# Altium footprint library Indruino.PcbLib: 383 footprints (part 20 of 24)
Each footprint in its own frame and in the unit in brackets; x right, y up, seen from the top. Pads: shape width x height; smd on the part's side, far side on the other; paste and mask are expansions set on the pad; w line width, h text height; cw(c..) or ccw(c..) is an arc to the next point about the centre after c.
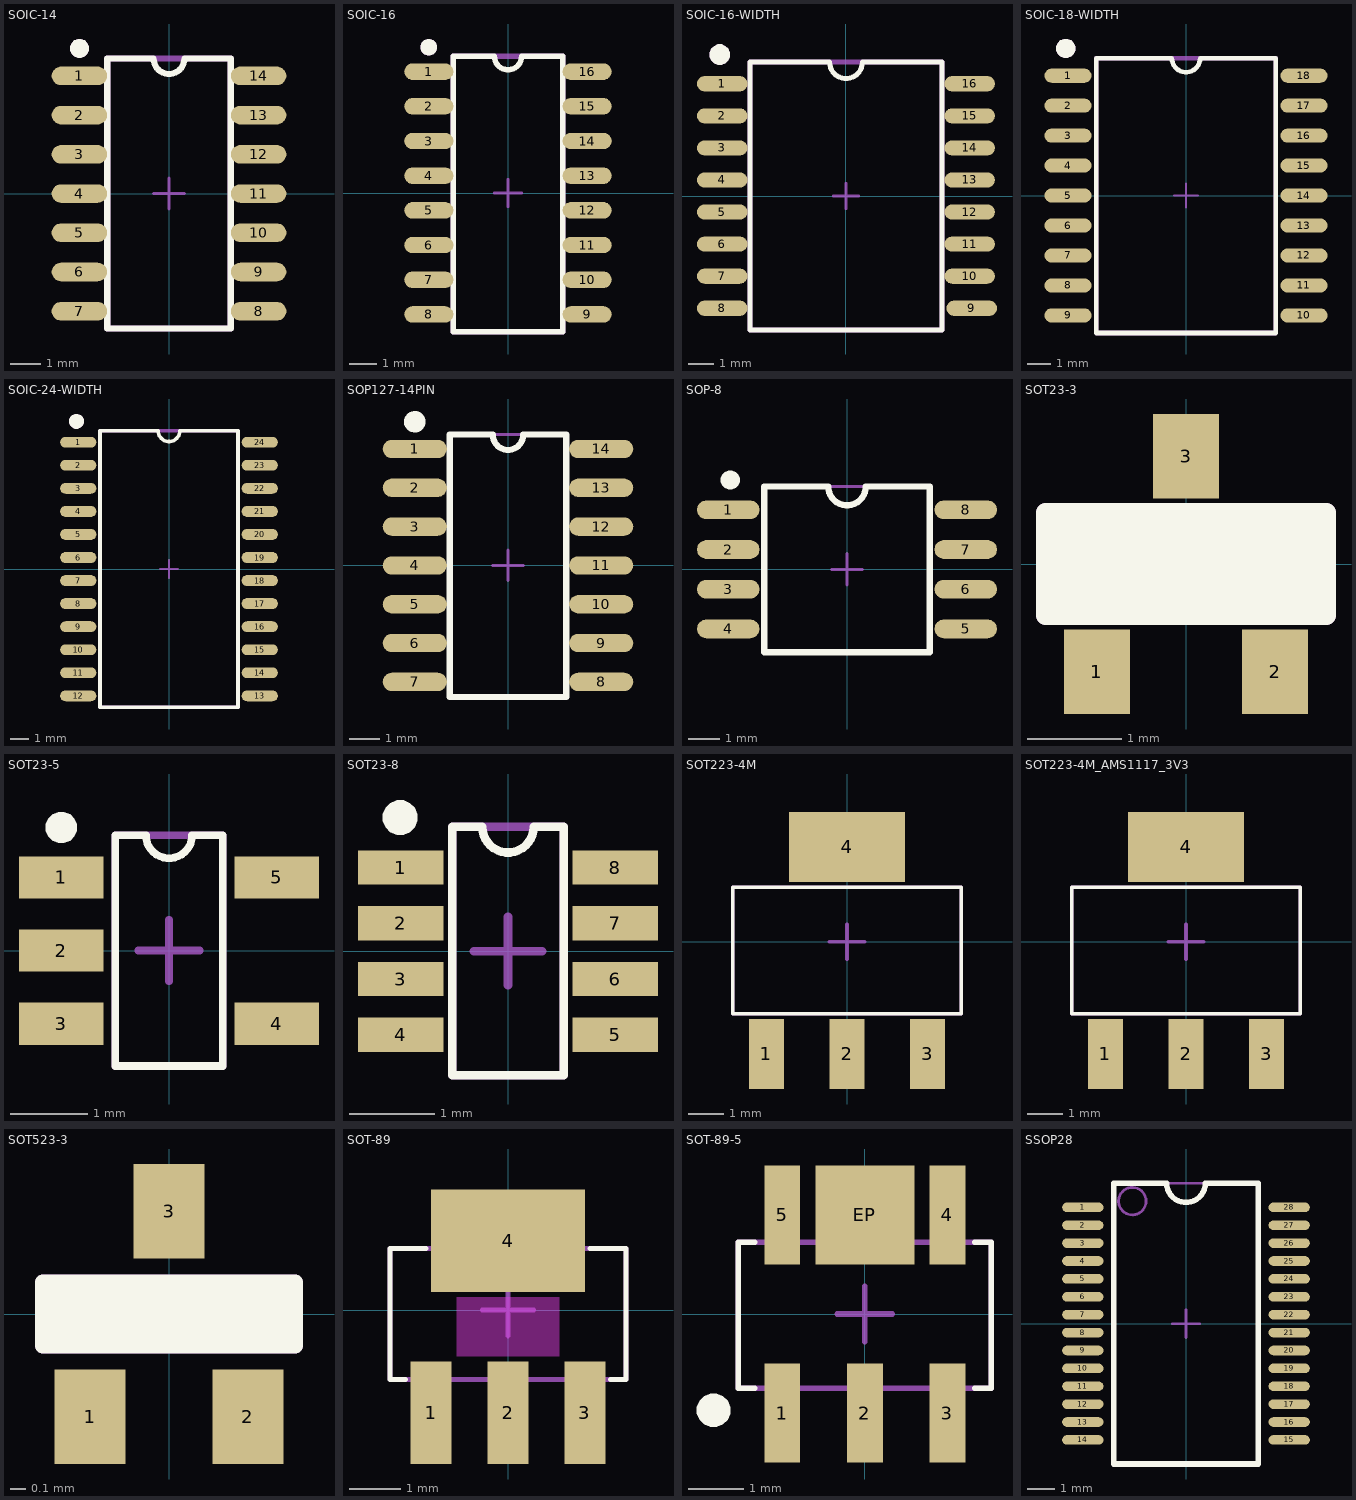
[diagram p19: the footprints below, top view; thin cyan lines are the x and y axes]

## SOIC-14 [mm] "14-Pin Small Outline Package 1.27 mm Pitch"
height 2
pads (14):
  oval 1.8x0.6 smd: 1(-2.9,3.81) 2(-2.9,2.54) 3(-2.9,1.27) 4(-2.9,0) 5(-2.9,-1.27) 6(-2.9,-2.54) 7(-2.9,-3.81) 8(2.9,-3.81) 9(2.9,-2.54) 10(2.9,-1.27) 11(2.9,0) 12(2.9,1.27) 13(2.9,2.54) 14(2.9,3.81)
Top Overlay:
  region: -2.9,4.405 -2.96,4.405 -3.07,4.451 -3.154,4.535 -3.2,4.645 -3.2,4.705 -3.2,4.765 -3.154,4.875 -3.07,4.959 -2.96,5.005 -2.9,5.005 -2.84,5.005 -2.73,4.959 -2.646,4.875 -2.6,4.765 -2.6,4.705 -2.6,4.645 -2.646,4.535 -2.73,4.451 -2.84,4.405
  lines w0.2: -2,-4.375 -2,4.375 -0.5,4.375 ccw(c0,4.375) 0.5,4.375 2,4.375 2,-4.375 -2,-4.375
Mechanical 13:
  region: -2.9,4.405 -2.96,4.405 -3.07,4.451 -3.154,4.535 -3.2,4.645 -3.2,4.705 -3.2,4.765 -3.154,4.875 -3.07,4.959 -2.96,5.005 -2.9,5.005 -2.84,5.005 -2.73,4.959 -2.646,4.875 -2.6,4.765 -2.6,4.705 -2.6,4.645 -2.646,4.535 -2.73,4.451 -2.84,4.405
  lines w0.2: -2,-4.375 -2,4.375 2,4.375 2,-4.375 -2,-4.375
  text "'.Designator'" at -0.525,3.8 h1.2
Mechanical 15:
  lines w0.1: -0.5,0 0.5,0 ; 0,-0.5 0,0.5
3D body "User Library-SOIC-14.step": height 1.75, standoff 0, extent -3,-4.375 3,4.375

## SOIC-16 [mm] "16-Pin Small Outline Package 1.27 mm Pitch"
height 2
pads (16):
  oval 1.8x0.6 smd: 1(-2.9,4.445) 2(-2.9,3.175) 3(-2.9,1.905) 4(-2.9,0.635) 5(-2.9,-0.635) 6(-2.9,-1.905) 7(-2.9,-3.175) 8(-2.9,-4.445) 9(2.9,-4.445) 10(2.9,-3.175) 11(2.9,-1.905) 12(2.9,-0.635) 13(2.9,0.635) 14(2.9,1.905) 15(2.9,3.175) 16(2.9,4.445)
Top Overlay:
  region: -2.9,5.04 -2.96,5.04 -3.07,5.086 -3.154,5.17 -3.2,5.28 -3.2,5.34 -3.2,5.4 -3.154,5.51 -3.07,5.594 -2.96,5.64 -2.9,5.64 -2.84,5.64 -2.73,5.594 -2.646,5.51 -2.6,5.4 -2.6,5.34 -2.6,5.28 -2.646,5.17 -2.73,5.086 -2.84,5.04
  lines w0.2: -2,-5.08 2,-5.08 2,5.01 0.5,5.01 cw(c0,5.01) -0.5,5.01 -2,5.01 -2,-5.08
Mechanical 13:
  region: -2.9,5.04 -2.96,5.04 -3.07,5.086 -3.154,5.17 -3.2,5.28 -3.2,5.34 -3.2,5.4 -3.154,5.51 -3.07,5.594 -2.96,5.64 -2.9,5.64 -2.84,5.64 -2.73,5.594 -2.646,5.51 -2.6,5.4 -2.6,5.34 -2.6,5.28 -2.646,5.17 -2.73,5.086 -2.84,5.04
  lines w0.2: -2,-5.08 2,-5.08 2,5.01 -2,5.01 -2,-5.08
  text "'.Designator'" at -0.4,4.425 h1.2
Mechanical 15:
  lines w0.1: -0.5,0 0.5,0 ; 0,-0.5 0,0.5
3D body "User Library-SOIC-16-2.STEP": height 1.75, standoff 0, extent -3,-5 3,5

## SOIC-16-WIDTH [mm]
pads (16):
  oval 2x0.6 smd: 1(-4.9,4.445) 2(-4.9,3.175) 3(-4.9,1.905) 4(-4.9,0.635) 5(-4.9,-0.635) 6(-4.9,-1.905) 7(-4.9,-3.175) 8(-4.9,-4.445) 9(4.98,-4.445) 10(4.9,-3.175) 11(4.9,-1.905) 12(4.9,-0.635) 13(4.9,0.635) 14(4.9,1.905) 15(4.9,3.175) 16(4.9,4.445)
Top Overlay:
  region: -5,5.2 -5.08,5.2 -5.227,5.261 -5.339,5.373 -5.4,5.52 -5.4,5.6 -5.4,5.68 -5.339,5.827 -5.227,5.939 -5.08,6 -5,6 -4.92,6 -4.773,5.939 -4.661,5.827 -4.6,5.68 -4.6,5.6 -4.6,5.52 -4.661,5.373 -4.773,5.261 -4.92,5.2
  lines w0.2: -3.8,-5.3 -3.8,5.3 -0.65,5.3 ccw(c0,5.3) 0.65,5.3 3.8,5.3 3.8,-5.3 -3.8,-5.3
Mechanical 13:
  region: -5,5.2 -5.08,5.2 -5.227,5.261 -5.339,5.373 -5.4,5.52 -5.4,5.6 -5.4,5.68 -5.339,5.827 -5.227,5.939 -5.08,6 -5,6 -4.92,6 -4.773,5.939 -4.661,5.827 -4.6,5.68 -4.6,5.6 -4.6,5.52 -4.661,5.373 -4.773,5.261 -4.92,5.2
  lines w0.2: -3.8,-5.3 3.8,-5.3 3.8,5.3 -3.8,5.3 -3.8,-5.3
  text "'.Designator'" at -0.525,4.8 h1.2
Mechanical 15:
  lines w0.1: -0.5,0 0.5,0 ; 0,-0.5 0,0.5
3D body "User Library-SOIC16_Wide_JEDEC_MS-013AA.step": height 2.62, standoff -0.03, extent -5.315,-5.25 5.315,5.25

## SOIC-18-WIDTH [mm]
pads (18):
  oval 2x0.6 smd: 1(-5,5.08) 2(-5,3.81) 3(-5,2.54) 4(-5,1.27) 5(-5,0) 6(-5,-1.27) 7(-5,-2.54) 8(-5,-3.81) 9(-5,-5.08) 10(5,-5.08) 11(5,-3.81) 12(5,-2.54) 13(5,-1.27) 14(5,0) 15(5,1.27) 16(5,2.54) 17(5,3.81) 18(5,5.08)
Top Overlay:
  region: -5.1,5.835 -5.18,5.835 -5.327,5.896 -5.439,6.008 -5.5,6.155 -5.5,6.235 -5.5,6.315 -5.439,6.462 -5.327,6.574 -5.18,6.635 -5.1,6.635 -5.02,6.635 -4.873,6.574 -4.761,6.462 -4.7,6.315 -4.7,6.235 -4.7,6.155 -4.761,6.008 -4.873,5.896 -5.02,5.835
  lines w0.2: -3.8,-5.825 3.8,-5.825 3.8,5.825 0.6,5.825 cw(c0,5.825) -0.6,5.825 -3.8,5.825 -3.8,-5.825
Mechanical 13:
  region: -5.1,5.835 -5.18,5.835 -5.327,5.896 -5.439,6.008 -5.5,6.155 -5.5,6.235 -5.5,6.315 -5.439,6.462 -5.327,6.574 -5.18,6.635 -5.1,6.635 -5.02,6.635 -4.873,6.574 -4.761,6.462 -4.7,6.315 -4.7,6.235 -4.7,6.155 -4.761,6.008 -4.873,5.896 -5.02,5.835
  lines w0.2: -3.8,-5.825 -3.8,5.825 3.8,5.825 3.8,-5.825 -3.8,-5.825
  text "'.Designator'" at -0.4,5.3 h1.2
Mechanical 15:
  lines w0.1: -0.5,0 0.5,0 ; 0,-0.5 0,0.5
3D body "SW3dPS-SOIC18-300.STEP": height 2.65, standoff 0, extent -5.15,-5.765 5.15,5.765

## SOIC-24-WIDTH [mm]
pads (24):
  oval 2x0.6 smd: 1(-5,6.985) 2(-5,5.715) 3(-5,4.445) 4(-5,3.175) 5(-5,1.905) 6(-5,0.635) 7(-5,-0.635) 8(-5,-1.905) 9(-5,-3.175) 10(-5,-4.445) 11(-5,-5.715) 12(-5,-6.985) 13(5,-6.985) 14(5,-5.715) 15(5,-4.445) 16(5,-3.175) 17(5,-1.905) 18(5,-0.635) 19(5,0.635) 20(5,1.905) 21(5,3.175) 22(5,4.445) 23(5,5.715) 24(5,6.985)
Top Overlay:
  region: -5.1,7.74 -5.18,7.74 -5.327,7.801 -5.439,7.913 -5.5,8.06 -5.5,8.14 -5.5,8.22 -5.439,8.367 -5.327,8.479 -5.18,8.54 -5.1,8.54 -5.02,8.54 -4.873,8.479 -4.761,8.367 -4.7,8.22 -4.7,8.14 -4.7,8.06 -4.761,7.913 -4.873,7.801 -5.02,7.74
  lines w0.2: -3.8,-7.62 -3.8,7.62 -0.6,7.62 ccw(c0,7.62) 0.6,7.62 3.8,7.62 3.8,-7.62 -3.8,-7.62
Mechanical 13:
  region: -5.1,7.74 -5.18,7.74 -5.327,7.801 -5.439,7.913 -5.5,8.06 -5.5,8.14 -5.5,8.22 -5.439,8.367 -5.327,8.479 -5.18,8.54 -5.1,8.54 -5.02,8.54 -4.873,8.479 -4.761,8.367 -4.7,8.22 -4.7,8.14 -4.7,8.06 -4.761,7.913 -4.873,7.801 -5.02,7.74
  lines w0.2: -3.8,-7.62 3.8,-7.62 3.8,7.62 -3.8,7.62 -3.8,-7.62
  text "'.Designator'" at -0.525,7.05 h1.2
Mechanical 15:
  lines w0.1: -0.5,0 0.5,0 ; 0,-0.5 0,0.5
3D body "User Library-SOIC_24-300.STEP": height 2.6, standoff 0, extent -5.19,-7.85 5.21,7.55

## SOP127-14PIN [mm] "14-Pin Small Outline Package 1.27 mm Pitch"
height 2
pads (14):
  oval 2.1x0.6 smd: 1(-3.048,3.81) 2(-3.048,2.54) 3(-3.048,1.27) 4(-3.048,0) 5(-3.048,-1.27) 6(-3.048,-2.54) 7(-3.048,-3.81) 8(3.048,-3.81) 9(3.048,-2.54) 10(3.048,-1.27) 11(3.048,0) 12(3.048,1.27) 13(3.048,2.54) 14(3.048,3.81)
Top Overlay:
  circle w0.2: c-3.048,4.699 r0.254
  region: -3.048,4.445 -3.099,4.445 -3.192,4.484 -3.263,4.555 -3.302,4.648 -3.302,4.699 -3.302,4.75 -3.263,4.843 -3.192,4.914 -3.099,4.953 -3.048,4.953 -2.997,4.953 -2.904,4.914 -2.833,4.843 -2.794,4.75 -2.794,4.699 -2.794,4.648 -2.833,4.555 -2.904,4.484 -2.997,4.445
  lines w0.2: -1.905,-4.3 -1.905,4.28 -0.5,4.28 ccw(c0,4.28) 0.5,4.28 1.905,4.28 1.905,-4.3 -1.905,-4.3
Mechanical 13:
  lines w0.1: -1.905,-4.3 -1.905,4.28 1.905,4.28 1.905,-4.3 -1.905,-4.3
Mechanical 15:
  lines w0.1: -0.5,0 0.5,0 ; 0,-0.5 0,0.5
3D body "User Library-14-SOP.STEP": height 1.8, standoff 0, extent -3,-4.28 3,4.28

## SOP-8 [mm]
pads (8):
  oval 2x0.6 smd: 1(-3.8,1.905) 2(-3.8,0.635) 3(-3.8,-0.635) 4(-3.8,-1.905) 5(3.8,-1.905) 6(3.8,-0.635) 7(3.8,0.635) 8(3.8,1.905)
Top Overlay:
  region: -3.738,2.562 -3.798,2.562 -3.908,2.608 -3.992,2.692 -4.038,2.802 -4.038,2.862 -4.038,2.922 -3.992,3.032 -3.908,3.116 -3.798,3.162 -3.738,3.162 -3.678,3.162 -3.568,3.116 -3.484,3.032 -3.438,2.922 -3.438,2.862 -3.438,2.802 -3.484,2.692 -3.568,2.608 -3.678,2.562
  lines w0.2: -2.65,-2.65 -2.65,2.65 -0.6,2.65 ccw(c0,2.65) 0.6,2.65 2.65,2.65 2.65,-2.65 -2.65,-2.65
Mechanical 13:
  lines w0.1: -2.65,-2.65 -2.65,2.65 2.65,2.65 2.65,-2.65 -2.65,-2.65
Mechanical 15:
  lines w0.1: -0.5,0 0.5,0 ; 0,-0.5 0,0.5
3D body "User Library-SOIC8_Wide_5mmx5mm.step": height 1.75, standoff -0.01, extent -4.052,-2.73 4.05,2.73

## SOT23-3 [mm]
pads (3):
  rect 0.7x0.9 smd: 1(-0.95,-1.15) 2(0.95,-1.15) 3(0,1.15)
Top Overlay:
  region: -1.5,-0.55 1.5,-0.55 1.5,0.55 -1.5,0.55
  lines w0.2: -1.5,-0.55 1.5,-0.55 1.5,0.55 -1.5,0.55 -1.5,-0.55
Mechanical 13:
  region: -1.5,-0.55 1.5,-0.55 1.5,0.55 -1.5,0.55
  lines w0.2: -1.5,-0.55 1.5,-0.55 1.5,0.55 -1.5,0.55 -1.5,-0.55
  text "'.Designator'" at -1.3,-2.6 h1.2
Mechanical 15:
  lines w0.1: -0.5,0 0.5,0 ; 0,-0.5 0,0.5
3D body "SW3DPS-SOT-23-DEFAULT.STEP": height 1.06, standoff -0.04, extent -1.5,-1.28 1.5,1.22

## SOT23-5 [mm]
pads (5):
  rect 1.1x0.55 smd: 1(-1.4,0.95) 2(-1.4,0) 3(-1.4,-0.95) 4(1.4,-0.95) 5(1.4,0.95)
Top Overlay:
  region: -1.4,1.4 -1.44,1.4 -1.513,1.43 -1.57,1.487 -1.6,1.56 -1.6,1.6 -1.6,1.64 -1.57,1.713 -1.513,1.77 -1.44,1.8 -1.4,1.8 -1.36,1.8 -1.287,1.77 -1.23,1.713 -1.2,1.64 -1.2,1.6 -1.2,1.56 -1.23,1.487 -1.287,1.43 -1.36,1.4
  lines w0.1: -0.7,-1.5 -0.7,1.5 -0.3,1.5 ccw(c0,1.5) 0.3,1.5 0.7,1.5 0.7,-1.5 -0.7,-1.5
Mechanical 13:
  lines w0.1: -0.7,-1.5 -0.7,1.5 0.7,1.5 0.7,-1.5 -0.7,-1.5
Mechanical 15:
  lines w0.1: -0.4,0 0.4,0 ; 0,-0.4 0,0.4
3D body "User Library-SOT23-5-1.STEP": height 1.3, standoff 0, extent -1.48,-1.5 1.52,1.5

## SOT23-8 [mm]
pads (8):
  rect 1x0.4 smd: 1(-1.25,0.975) 2(-1.25,0.325) 3(-1.25,-0.325) 4(-1.25,-0.975) 5(1.25,-0.975) 6(1.25,-0.325) 7(1.25,0.325) 8(1.25,0.975)
Top Overlay:
  region: -1.259,1.359 -1.298,1.359 -1.372,1.389 -1.428,1.445 -1.459,1.519 -1.459,1.559 -1.459,1.598 -1.428,1.672 -1.372,1.728 -1.298,1.759 -1.259,1.759 -1.219,1.759 -1.145,1.728 -1.089,1.672 -1.059,1.598 -1.059,1.559 -1.059,1.519 -1.089,1.445 -1.145,1.389 -1.219,1.359
  lines w0.1: -0.65,-1.45 0.65,-1.45 0.65,1.45 0.3,1.45 cw(c0,1.45) -0.3,1.45 -0.65,1.45 -0.65,-1.45
Mechanical 13:
  lines w0.1: -0.65,-1.45 -0.65,1.45 0.65,1.45 0.65,-1.45 -0.65,-1.45
Mechanical 15:
  lines w0.1: -0.4,0 0.4,0 ; 0,-0.4 0,0.4
3D body "User Library-sot238.step": height 1.2, standoff 0, extent -1.38,-1.47 1.42,1.47

## SOT223-4M [mm] "SOT223, 4-Leads, Body 6.5x3.5mm, Pitch 2.3mm, Lead Span 7mm, IPC Low Density"
height 1.8
pads (4):
  rect 1x2 smd: 1(-2.3,-3.2) 2(0,-3.2) 3(2.3,-3.2)
  rect 3.3x2 smd: 4(0,2.7)
Top Overlay:
  lines w0.1: -3.25,-2.05 3.26,-2.05 3.26,1.55 -3.25,1.55 -3.25,-2.05
Mechanical 13:
  lines w0.1: -3.25,-2.05 3.25,-2.05 3.25,1.55 -3.25,1.55 -3.25,-2.05
Mechanical 15:
  lines w0.1: -0.5,0 0.5,0 ; 0,-0.5 0,0.5
3D body "User Library-SOT-223-3.step": height 1.67, standoff -0.01, extent -3.25,-3.74 3.25,3.22

## SOT223-4M_AMS1117_3V3 [mm] "SOT223, 4-Leads, Body 6.5x3.5mm, Pitch 2.3mm, Lead Span 7mm, IPC Low Density"
height 1.8
pads (4):
  rect 1x2 smd: 1(-2.3,-3.2) 2(0,-3.2) 3(2.3,-3.2)
  rect 3.3x2 smd: 4(0,2.7)
Top Overlay:
  lines w0.1: -3.25,-2.05 3.26,-2.05 3.26,1.55 -3.25,1.55 -3.25,-2.05
Mechanical 13:
  lines w0.1: -3.25,-2.05 3.25,-2.05 3.25,1.55 -3.25,1.55 -3.25,-2.05
Mechanical 15:
  lines w0.1: -0.5,0 0.5,0 ; 0,-0.5 0,0.5
3D body "AMS1117_3V3_axisY.step": height 1.9, standoff -0.01, extent -3.355,-3.909 3.355,3.391

## SOT523-3 [mm]
pads (3):
  rect 0.45x0.6 smd: 1(-0.5,-0.65) 2(0.5,-0.65) 3(0,0.65)
Top Overlay:
  region: -0.8,-0.2 0.8,-0.2 0.8,0.2 -0.8,0.2
  lines w0.1: -0.8,-0.2 0.8,-0.2 0.8,0.2 -0.8,0.2 -0.8,-0.2
Mechanical 13:
  lines w0.1: -0.8,-0.2 -0.8,0.2 0.8,0.2 0.8,-0.2 -0.8,-0.2
3D body "User Library-SOT-523.STEP": height 0.8, standoff 0, extent -0.8,-0.8 0.8,0.8

## SOT-89 [mm] "SOT-223/SC-73; 4 Leads; Body 6.7 x 7.3 mm, inc. leads (LxW max)"
height 1.8
pads (4):
  rect 0.8x2 smd: 1(-1.5,-2) 2(0,-2) 3(1.5,-2)
  rect 3x2 smd: 4(0,1.35)
Top Overlay:
  lines w0.1: -2,-1.35 -2.3,-1.35 -2.3,1.2 -1.6,1.2 ; 1.6,1.2 2.3,1.2 2.3,-1.35 2,-1.35
Keep-Out Layer:
  pour cut-out: -1,-0.9 1,-0.9 1,0.25 -1,0.25
Mechanical 13:
  lines w0.1: -2.3,-1.35 2.3,-1.35 2.3,1.2 -2.3,1.2 -2.3,-1.35
Mechanical 15:
  lines w0.1: -0.5,0 0.5,0 ; 0,-0.5 0,0.5
3D body "SW3dPS-SOT-89-1.STEP": height 1.51, standoff 0, extent -2.255,-2.43 2.245,1.87

## SOT-89-5 [mm]
pads (6):
  rect 0.65x1.8 smd: 1(-1.5,-1.8) 2(0,-1.8) 3(1.5,-1.8) 4(1.5,1.8) 5(-1.5,1.8)
  rect 1.8x1.8 smd: EP(0,1.8)
Top Overlay:
  region: -2.75,-2.05 -2.81,-2.05 -2.92,-2.004 -3.004,-1.92 -3.05,-1.81 -3.05,-1.75 -3.05,-1.69 -3.004,-1.58 -2.92,-1.496 -2.81,-1.45 -2.75,-1.45 -2.69,-1.45 -2.58,-1.496 -2.496,-1.58 -2.45,-1.69 -2.45,-1.75 -2.45,-1.81 -2.496,-1.92 -2.58,-2.004 -2.69,-2.05
  lines w0.1: -2,-1.35 -2.3,-1.35 -2.3,1.3 -2,1.3 ; 2,-1.35 2.3,-1.35 2.3,1.3 2,1.3
Mechanical 13:
  lines w0.1: -2.3,-1.35 -2.3,1.3 2.3,1.3 2.3,-1.35 -2.3,-1.35
Mechanical 15:
  lines w0.1: -0.5,0 0.5,0 ; 0,-0.5 0,0.5
3D body "User Library-SOT-89-5.STEP": height 1.5, standoff 0, extent -2.25,-2.175 2.25,2.175

## SSOP28 [mm] "TSOP, 28-Leads, Body 9.7x4.4mm, Pitch 0.65mm, IPC Low Density"
height 1.1
pads (28):
  oval 1.5x0.35 smd: 1(-3.75,4.225) 2(-3.75,3.575) 3(-3.75,2.925) 4(-3.75,2.275) 5(-3.75,1.625) 6(-3.75,0.975) 7(-3.75,0.325) 8(-3.75,-0.325) 9(-3.75,-0.975) 10(-3.75,-1.625) 11(-3.75,-2.275) 12(-3.75,-2.925) 13(-3.75,-3.575) 14(-3.75,-4.225) 15(3.75,-4.225) 16(3.75,-3.575) 17(3.75,-2.925) 18(3.75,-2.275) 19(3.75,-1.625) 20(3.75,-0.975) 21(3.75,-0.325) 22(3.75,0.325) 23(3.75,0.975) 24(3.75,1.625) 25(3.75,2.275) 26(3.75,2.925) 27(3.75,3.575) 28(3.75,4.225)
Top Overlay:
  lines w0.2: -2.63,-5.1 2.63,-5.1 2.63,5.1 0.7,5.1 cw(c0,5.1) -0.7,5.1 -2.63,5.1 -2.63,-5.1
Mechanical 13:
  circle w0.1: c-1.95,4.45 r0.5
  lines w0.1: -2.63,-5.1 2.63,-5.1 2.63,5.1 -2.63,5.1 -2.63,-5.1
Mechanical 15:
  lines w0.1: -0.5,0 0.5,0 ; 0,-0.5 0,0.5
3D body "User Library-SSOP-28-2.step": height 1.97, standoff -0.03, extent -3.906,-5.1 3.906,5.1